# Altium footprint library WE-SHC.PcbLib: 139 footprints (part 2 of 10)
Each footprint in its own frame and in the unit in brackets; x right, y up, seen from the top. Pads: shape width x height; smd on the part's side, far side on the other; paste and mask are expansions set on the pad; w line width, h text height; cw(c..) or ccw(c..) is an arc to the next point about the centre after c.
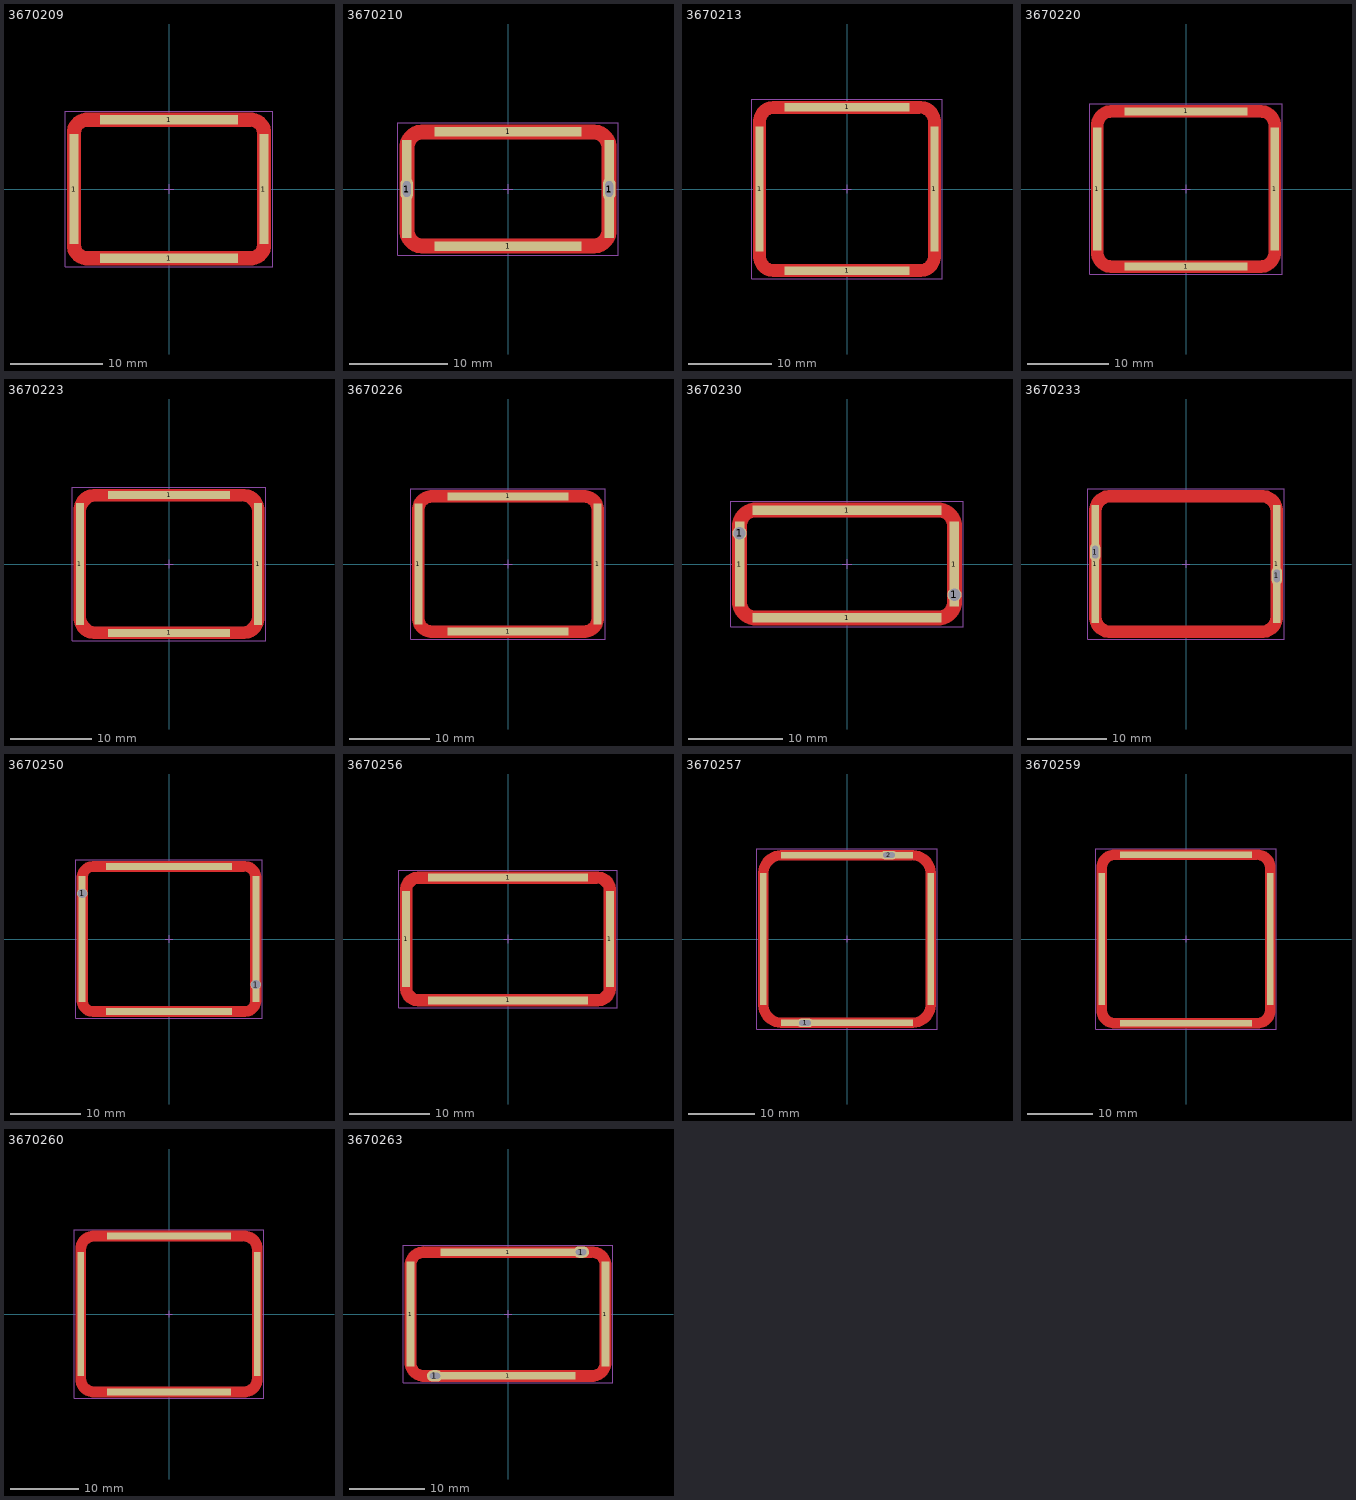
[diagram p1: the footprints below, top view; thin cyan lines are the x and y axes]

## 3670209 [mm] "Shielding Cabinet, SMT Frame Seamless, 20.9x15.3x1.7mm"
height 1.7
pads (4):
  rect 1x12 smd paste-2539.97 mask-2222: 1(-10.35,0) 1(10.35,0)
  rect 15x1 smd paste-2539.97 mask-2222: 1(0,-7.55) 1(0,7.55)
Top Layer:
  region: -11.1,-0.25 -11.1,-6.15 -11.1,-6.362 -11.017,-6.777 -10.855,-7.168 -10.62,-7.521 -10.321,-7.82 -9.968,-8.055 -9.577,-8.217 -9.162,-8.3 -8.95,-8.3 8.95,-8.3 9.162,-8.3 9.577,-8.217 9.968,-8.055 10.321,-7.82 10.62,-7.521 10.855,-7.168 11.017,-6.777 11.1,-6.362 11.1,-6.15 11.1,-0.25 9.6,-0.25 9.6,-6.15 9.588,-6.277 9.49,-6.511 9.311,-6.69 9.077,-6.788 8.95,-6.8 -8.95,-6.8 -9.077,-6.788 -9.311,-6.69 -9.49,-6.511 -9.588,-6.277 -9.6,-6.15 -9.6,-0.25
  region: -11.1,-1 -11.1,6.15 -11.1,6.362 -11.017,6.777 -10.855,7.168 -10.62,7.521 -10.321,7.82 -9.968,8.055 -9.577,8.217 -9.162,8.3 -8.95,8.3 8.95,8.3 9.162,8.3 9.577,8.217 9.968,8.055 10.321,7.82 10.62,7.521 10.855,7.168 11.017,6.777 11.1,6.362 11.1,6.15 11.1,-1 9.6,-1 9.6,6.15 9.588,6.277 9.49,6.511 9.311,6.69 9.077,6.788 8.95,6.8 -8.95,6.8 -9.077,6.788 -9.311,6.69 -9.49,6.511 -9.588,6.277 -9.6,6.15 -9.6,-1
Top Paste:
  region: -11.1,0.25 -11.1,6.15 -11.1,6.362 -11.017,6.777 -10.855,7.168 -10.62,7.521 -10.321,7.82 -9.968,8.055 -9.577,8.217 -9.162,8.3 -8.95,8.3 8.95,8.3 9.162,8.3 9.577,8.217 9.968,8.055 10.321,7.82 10.62,7.521 10.855,7.168 11.017,6.777 11.1,6.362 11.1,6.15 11.1,0.25 9.6,0.25 9.6,6.15 9.588,6.277 9.49,6.511 9.311,6.69 9.077,6.788 8.95,6.8 -8.95,6.8 -9.077,6.788 -9.311,6.69 -9.49,6.511 -9.588,6.277 -9.6,6.15 -9.6,0.25
  region: -11.1,-0.25 -11.1,-6.15 -11.1,-6.362 -11.017,-6.777 -10.855,-7.168 -10.62,-7.521 -10.321,-7.82 -9.968,-8.055 -9.577,-8.217 -9.162,-8.3 -8.95,-8.3 8.95,-8.3 9.162,-8.3 9.577,-8.217 9.968,-8.055 10.321,-7.82 10.62,-7.521 10.855,-7.168 11.017,-6.777 11.1,-6.362 11.1,-6.15 11.1,-0.25 9.6,-0.25 9.6,-6.15 9.588,-6.277 9.49,-6.511 9.311,-6.69 9.077,-6.788 8.95,-6.8 -8.95,-6.8 -9.077,-6.788 -9.311,-6.69 -9.49,-6.511 -9.588,-6.277 -9.6,-6.15 -9.6,-0.25
Notes:
  text "recommended tin paste thickness=0.5mm / customer to define the final stencil gap" at -5.6,-9.85 h0.4
Top Designator:
  text ".Designator" at -7.498,-0.5 h1.5
Top Component Outline:
  lines w0.1: -10.45,-6.15 ccw(c-8.95,-6.15) -8.95,-7.65 8.95,-7.65 ccw(c8.95,-6.15) 10.45,-6.15 10.45,6.15 ccw(c8.95,6.15) 8.95,7.65 -8.95,7.65 ccw(c-8.95,6.15) -10.45,6.15 -10.45,-6.15
Top 3D Body:
  lines w0.1: -10.45,-6.15 ccw(c-8.95,-6.15) -8.95,-7.65 8.95,-7.65 ccw(c8.95,-6.15) 10.45,-6.15 10.45,6.15 ccw(c8.95,6.15) 8.95,7.65 -8.95,7.65 ccw(c-8.95,6.15) -10.45,6.15 -10.45,-6.15
Top Courtyard:
  lines w0.05: -0.5,0 0.5,0 ; 0,-0.5 0,0.5 ; -11.3,-8.5 -11.3,8.5 11.3,8.5 11.3,-8.5 -11.3,-8.5
3D body "3670209.stp": height 1.7, standoff 0, extent -10.45,-7.65 10.45,7.65

## 3670210 [mm] "Shielding Cabinet, SMT Frame Seamless, 21x12x5mm"
height 5
pads (6):
  rect 1x10 smd paste-2539.97 mask-2222: 1(-10.35,0) 1(10.35,0)
  oval 1.3x2.4 hole 0.8 slot 1.6 at 90 deg: 1(-10.35,0) 1(10.35,0)
  rect 15x1 smd paste-2539.97 mask-2222: 1(0,-5.85) 1(0,5.85)
Top Layer:
  region: -11.1,-4.2 -11.1,4.2 -11.1,4.436 -11.008,4.9 -10.827,5.337 -10.564,5.73 -10.23,6.064 -9.837,6.327 -9.4,6.508 -8.936,6.6 -8.7,6.6 1,6.6 1,5.1 -8.7,5.1 -8.788,5.096 -8.961,5.061 -9.124,4.994 -9.271,4.896 -9.396,4.771 -9.494,4.624 -9.561,4.461 -9.596,4.288 -9.6,4.2 -9.6,-4.2 -9.596,-4.288 -9.561,-4.461 -9.494,-4.624 -9.396,-4.771 -9.271,-4.896 -9.124,-4.994 -8.961,-5.061 -8.788,-5.096 -8.7,-5.1 1,-5.1 1,-6.6 -8.7,-6.6 -8.936,-6.6 -9.4,-6.508 -9.837,-6.327 -10.23,-6.064 -10.564,-5.73 -10.827,-5.337 -11.008,-4.9 -11.1,-4.436
  region: 11.1,-4.2 11.1,4.2 11.1,4.436 11.008,4.9 10.827,5.337 10.564,5.73 10.23,6.064 9.837,6.327 9.4,6.508 8.936,6.6 8.7,6.6 0.25,6.6 0.25,5.1 8.7,5.1 8.788,5.096 8.961,5.061 9.124,4.994 9.271,4.896 9.396,4.771 9.494,4.624 9.561,4.461 9.596,4.288 9.6,4.2 9.6,-4.2 9.596,-4.288 9.561,-4.461 9.494,-4.624 9.396,-4.771 9.271,-4.896 9.124,-4.994 8.961,-5.061 8.788,-5.096 8.7,-5.1 0.25,-5.1 0.25,-6.6 8.7,-6.6 8.936,-6.6 9.4,-6.508 9.837,-6.327 10.23,-6.064 10.564,-5.73 10.827,-5.337 11.008,-4.9 11.1,-4.436
Top Paste:
  region: 11.1,-4.2 11.1,4.2 11.1,4.436 11.008,4.9 10.827,5.337 10.564,5.73 10.23,6.064 9.837,6.327 9.4,6.508 8.936,6.6 8.7,6.6 0.25,6.6 0.25,5.1 8.7,5.1 8.788,5.096 8.961,5.061 9.124,4.994 9.271,4.896 9.396,4.771 9.494,4.624 9.561,4.461 9.596,4.288 9.6,4.2 9.6,-4.2 9.596,-4.288 9.561,-4.461 9.494,-4.624 9.396,-4.771 9.271,-4.896 9.124,-4.994 8.961,-5.061 8.788,-5.096 8.7,-5.1 0.25,-5.1 0.25,-6.6 8.7,-6.6 8.936,-6.6 9.4,-6.508 9.837,-6.327 10.23,-6.064 10.564,-5.73 10.827,-5.337 11.008,-4.9 11.1,-4.436
  region: -11.1,-4.2 -11.1,4.2 -11.1,4.436 -11.008,4.9 -10.827,5.337 -10.564,5.73 -10.23,6.064 -9.837,6.327 -9.4,6.508 -8.936,6.6 -8.7,6.6 -0.25,6.6 -0.25,5.1 -8.7,5.1 -8.788,5.096 -8.961,5.061 -9.124,4.994 -9.271,4.896 -9.396,4.771 -9.494,4.624 -9.561,4.461 -9.596,4.288 -9.6,4.2 -9.6,-4.2 -9.596,-4.288 -9.561,-4.461 -9.494,-4.624 -9.396,-4.771 -9.271,-4.896 -9.124,-4.994 -8.961,-5.061 -8.788,-5.096 -8.7,-5.1 -0.25,-5.1 -0.25,-6.6 -8.7,-6.6 -8.936,-6.6 -9.4,-6.508 -9.837,-6.327 -10.23,-6.064 -10.564,-5.73 -10.827,-5.337 -11.008,-4.9 -11.1,-4.436
Notes:
  text "recommended tin paste thickness=0.5mm / customer to define the final stencil gap" at -5.6,-8.2 h0.4
Top Designator:
  text ".Designator" at -7.498,-0.5 h1.5
Top Component Outline:
  lines w0.1: -10.5,-4.25 ccw(c-8.75,-4.25) -8.75,-6 8.75,-6 ccw(c8.75,-4.25) 10.5,-4.25 10.5,4.25 ccw(c8.75,4.25) 8.75,6 -8.75,6 ccw(c-8.75,4.25) -10.5,4.25 -10.5,-4.25
Top 3D Body:
  lines w0.1: -10.5,-4.25 ccw(c-8.75,-4.25) -8.75,-6 8.75,-6 ccw(c8.75,-4.25) 10.5,-4.25 10.5,4.25 ccw(c8.75,4.25) 8.75,6 -8.75,6 ccw(c-8.75,4.25) -10.5,4.25 -10.5,-4.25
Top Courtyard:
  lines w0.05: -0.5,0 0.5,0 ; 0,-0.5 0,0.5 ; -11.3,-6.8 11.3,-6.8 11.3,6.8 -11.3,6.8 -11.3,-6.8
3D body "3670210.stp": height 5, standoff -1, extent -10.5,-6 10.5,6

## 3670213 [mm] "Shielding Cabinet, SMT Frame Seamless, 21.3x19.9x2.9mm"
height 2.9
pads (4):
  rect 1x15 smd paste-2539.97 mask-2222: 1(-10.5,0) 1(10.5,0)
  rect 15x1 smd paste-2539.97 mask-2222: 1(0,-9.8) 1(0,9.8)
Top Layer:
  region: -11.25,-1 -11.25,8.05 -11.25,8.296 -11.154,8.779 -10.965,9.234 -10.692,9.644 -10.344,9.992 -9.934,10.265 -9.479,10.454 -8.996,10.55 -8.75,10.55 8.75,10.55 8.996,10.55 9.479,10.454 9.934,10.265 10.344,9.992 10.692,9.644 10.965,9.234 11.154,8.779 11.25,8.296 11.25,8.05 11.25,-1 9.75,-1 9.75,8.05 9.745,8.148 9.707,8.34 9.632,8.521 9.523,8.684 9.384,8.823 9.221,8.932 9.04,9.007 8.848,9.045 8.75,9.05 -8.75,9.05 -8.848,9.045 -9.04,9.007 -9.221,8.932 -9.384,8.823 -9.523,8.684 -9.632,8.521 -9.707,8.34 -9.745,8.148 -9.75,8.05 -9.75,-1
  region: -11.25,-0.25 -11.25,-8.05 -11.25,-8.296 -11.154,-8.779 -10.965,-9.234 -10.692,-9.644 -10.344,-9.992 -9.934,-10.265 -9.479,-10.454 -8.996,-10.55 -8.75,-10.55 8.75,-10.55 8.996,-10.55 9.479,-10.454 9.934,-10.265 10.344,-9.992 10.692,-9.644 10.965,-9.234 11.154,-8.779 11.25,-8.296 11.25,-8.05 11.25,-0.25 9.75,-0.25 9.75,-8.05 9.745,-8.148 9.707,-8.34 9.632,-8.521 9.523,-8.684 9.384,-8.823 9.221,-8.932 9.04,-9.007 8.848,-9.045 8.75,-9.05 -8.75,-9.05 -8.848,-9.045 -9.04,-9.007 -9.221,-8.932 -9.384,-8.823 -9.523,-8.684 -9.632,-8.521 -9.707,-8.34 -9.745,-8.148 -9.75,-8.05 -9.75,-0.25
Top Paste:
  region: -11.25,-0.25 -11.25,-8.05 -11.25,-8.296 -11.154,-8.779 -10.965,-9.234 -10.692,-9.644 -10.344,-9.992 -9.934,-10.265 -9.479,-10.454 -8.996,-10.55 -8.75,-10.55 8.75,-10.55 8.996,-10.55 9.479,-10.454 9.934,-10.265 10.344,-9.992 10.692,-9.644 10.965,-9.234 11.154,-8.779 11.25,-8.296 11.25,-8.05 11.25,-0.25 9.75,-0.25 9.75,-8.05 9.745,-8.148 9.707,-8.34 9.632,-8.521 9.523,-8.684 9.384,-8.823 9.221,-8.932 9.04,-9.007 8.848,-9.045 8.75,-9.05 -8.75,-9.05 -8.848,-9.045 -9.04,-9.007 -9.221,-8.932 -9.384,-8.823 -9.523,-8.684 -9.632,-8.521 -9.707,-8.34 -9.745,-8.148 -9.75,-8.05 -9.75,-0.25
  region: -11.25,0.25 -11.25,8.05 -11.25,8.296 -11.154,8.779 -10.965,9.234 -10.692,9.644 -10.344,9.992 -9.934,10.265 -9.479,10.454 -8.996,10.55 -8.75,10.55 8.75,10.55 8.996,10.55 9.479,10.454 9.934,10.265 10.344,9.992 10.692,9.644 10.965,9.234 11.154,8.779 11.25,8.296 11.25,8.05 11.25,0.25 9.75,0.25 9.75,8.05 9.745,8.148 9.707,8.34 9.632,8.521 9.523,8.684 9.384,8.823 9.221,8.932 9.04,9.007 8.848,9.045 8.75,9.05 -8.75,9.05 -8.848,9.045 -9.04,9.007 -9.221,8.932 -9.384,8.823 -9.523,8.684 -9.632,8.521 -9.707,8.34 -9.745,8.148 -9.75,8.05 -9.75,0.25
Notes:
  text "recommended tin paste thickness=0.5mm / customer to define the final stencil gap" at -5.1,-12.2 h0.4
Top Designator:
  text ".Designator" at -7.498,-0.5 h1.5
Top Component Outline:
  lines w0.1: -10.65,-7.95 ccw(c-8.65,-7.95) -8.65,-9.95 8.65,-9.95 ccw(c8.65,-7.95) 10.65,-7.95 10.65,7.95 ccw(c8.65,7.95) 8.65,9.95 -8.65,9.95 ccw(c-8.65,7.95) -10.65,7.95 -10.65,-7.95
Top 3D Body:
  lines w0.1: -10.65,-7.95 ccw(c-8.65,-7.95) -8.65,-9.95 8.65,-9.95 ccw(c8.65,-7.95) 10.65,-7.95 10.65,7.95 ccw(c8.65,7.95) 8.65,9.95 -8.65,9.95 ccw(c-8.65,7.95) -10.65,7.95 -10.65,-7.95
Top Courtyard:
  lines w0.05: -0.5,0 0.5,0 ; 0,-0.5 0,0.5 ; -11.45,-10.75 11.45,-10.75 11.45,10.75 -11.45,10.75 -11.45,-10.75
3D body "3670213.stp": height 2.9, standoff 0, extent -10.65,-9.95 10.65,9.95

## 3670220 [mm] "Shielding Cabinet, SMT Frame Seamless, 22x19.3x3.3mm"
height 3.3
pads (4):
  rect 1x15 smd paste-2539.97 mask-2222: 1(-10.85,0) 1(10.85,0)
  rect 15x1 smd paste-2539.97 mask-2222: 1(0,-9.5) 1(0,9.5)
Top Layer:
  region: -11.6,-0.25 -11.6,-7.75 -11.6,-7.996 -11.504,-8.479 -11.315,-8.934 -11.042,-9.344 -10.694,-9.692 -10.284,-9.965 -9.829,-10.154 -9.346,-10.25 -9.1,-10.25 9.1,-10.25 9.346,-10.25 9.829,-10.154 10.284,-9.965 10.694,-9.692 11.042,-9.344 11.315,-8.934 11.504,-8.479 11.6,-7.996 11.6,-7.75 11.6,-0.25 10.1,-0.25 10.1,-7.75 10.095,-7.848 10.057,-8.04 9.982,-8.221 9.873,-8.384 9.734,-8.523 9.571,-8.632 9.39,-8.707 9.198,-8.745 9.1,-8.75 -9.1,-8.75 -9.198,-8.745 -9.39,-8.707 -9.571,-8.632 -9.734,-8.523 -9.873,-8.384 -9.982,-8.221 -10.057,-8.04 -10.095,-7.848 -10.1,-7.75 -10.1,-0.25
  region: -11.6,-1 -11.6,7.75 -11.6,7.996 -11.504,8.479 -11.315,8.934 -11.042,9.344 -10.694,9.692 -10.284,9.965 -9.829,10.154 -9.346,10.25 -9.1,10.25 9.1,10.25 9.346,10.25 9.829,10.154 10.284,9.965 10.694,9.692 11.042,9.344 11.315,8.934 11.504,8.479 11.6,7.996 11.6,7.75 11.6,-1 10.1,-1 10.1,7.75 10.095,7.848 10.057,8.04 9.982,8.221 9.873,8.384 9.734,8.523 9.571,8.632 9.39,8.707 9.198,8.745 9.1,8.75 -9.1,8.75 -9.198,8.745 -9.39,8.707 -9.571,8.632 -9.734,8.523 -9.873,8.384 -9.982,8.221 -10.057,8.04 -10.095,7.848 -10.1,7.75 -10.1,-1
Top Paste:
  region: -11.6,0.25 -11.6,7.75 -11.6,7.996 -11.504,8.479 -11.315,8.934 -11.042,9.344 -10.694,9.692 -10.284,9.965 -9.829,10.154 -9.346,10.25 -9.1,10.25 9.1,10.25 9.346,10.25 9.829,10.154 10.284,9.965 10.694,9.692 11.042,9.344 11.315,8.934 11.504,8.479 11.6,7.996 11.6,7.75 11.6,0.25 10.1,0.25 10.1,7.75 10.095,7.848 10.057,8.04 9.982,8.221 9.873,8.384 9.734,8.523 9.571,8.632 9.39,8.707 9.198,8.745 9.1,8.75 -9.1,8.75 -9.198,8.745 -9.39,8.707 -9.571,8.632 -9.734,8.523 -9.873,8.384 -9.982,8.221 -10.057,8.04 -10.095,7.848 -10.1,7.75 -10.1,0.25
  region: -11.6,-0.25 -11.6,-7.75 -11.6,-7.996 -11.504,-8.479 -11.315,-8.934 -11.042,-9.344 -10.694,-9.692 -10.284,-9.965 -9.829,-10.154 -9.346,-10.25 -9.1,-10.25 9.1,-10.25 9.346,-10.25 9.829,-10.154 10.284,-9.965 10.694,-9.692 11.042,-9.344 11.315,-8.934 11.504,-8.479 11.6,-7.996 11.6,-7.75 11.6,-0.25 10.1,-0.25 10.1,-7.75 10.095,-7.848 10.057,-8.04 9.982,-8.221 9.873,-8.384 9.734,-8.523 9.571,-8.632 9.39,-8.707 9.198,-8.745 9.1,-8.75 -9.1,-8.75 -9.198,-8.745 -9.39,-8.707 -9.571,-8.632 -9.734,-8.523 -9.873,-8.384 -9.982,-8.221 -10.057,-8.04 -10.095,-7.848 -10.1,-7.75 -10.1,-0.25
Notes:
  text "recommended tin paste thickness=0.5mm / customer to define the final stencil gap" at -6,-11.85 h0.4
Top Designator:
  text ".Designator" at -7.498,-0.5 h1.5
Top Component Outline:
  lines w0.1: -11,-7.65 ccw(c-9,-7.65) -9,-9.65 9,-9.65 ccw(c9,-7.65) 11,-7.65 11,7.65 ccw(c9,7.65) 9,9.65 -9,9.65 ccw(c-9,7.65) -11,7.65 -11,-7.65
Top 3D Body:
  lines w0.1: -11,-7.65 ccw(c-9,-7.65) -9,-9.65 9,-9.65 ccw(c9,-7.65) 11,-7.65 11,7.65 ccw(c9,7.65) 9,9.65 -9,9.65 ccw(c-9,7.65) -11,7.65 -11,-7.65
Top Courtyard:
  lines w0.05: -0.5,0 0.5,0 ; 0,-0.5 0,0.5 ; -11.8,-10.45 -11.8,10.45 11.8,10.45 11.8,-10.45 -11.8,-10.45
3D body "3670220.stp": height 3.3, standoff 0, extent -11,-9.65 11,9.65

## 3670223 [mm] "Shielding Cabinet, SMT Frame Seamless, 22.3x17.3x5mm"
height 5
pads (4):
  rect 1x15 smd paste-2539.97 mask-2222: 1(-11,0) 1(11,0)
  rect 15x1 smd paste-2539.97 mask-2222: 1(0,-8.5) 1(0,8.5)
Top Layer:
  region: -11.75,-1.3 -11.75,6.65 -11.75,6.906 -11.65,7.408 -11.454,7.882 -11.17,8.307 -10.807,8.67 -10.382,8.954 -9.908,9.15 -9.406,9.25 -9.15,9.25 9.15,9.25 9.406,9.25 9.908,9.15 10.382,8.954 10.807,8.67 11.17,8.307 11.454,7.882 11.65,7.408 11.75,6.906 11.75,6.65 11.75,-1.3 10.25,-1.3 10.25,6.45 10.244,6.577 10.194,6.827 10.096,7.063 9.955,7.275 9.775,7.455 9.563,7.596 9.327,7.694 9.077,7.744 8.95,7.75 -8.95,7.75 -9.077,7.744 -9.327,7.694 -9.563,7.596 -9.775,7.455 -9.955,7.275 -10.096,7.063 -10.194,6.827 -10.244,6.577 -10.25,6.45 -10.25,-1.3
  region: -11.75,-0.25 -11.75,-6.65 -11.75,-6.906 -11.65,-7.408 -11.454,-7.882 -11.17,-8.307 -10.807,-8.67 -10.382,-8.954 -9.908,-9.15 -9.406,-9.25 -9.15,-9.25 9.15,-9.25 9.406,-9.25 9.908,-9.15 10.382,-8.954 10.807,-8.67 11.17,-8.307 11.454,-7.882 11.65,-7.408 11.75,-6.906 11.75,-6.65 11.75,-0.25 10.25,-0.25 10.25,-6.45 10.244,-6.577 10.194,-6.827 10.096,-7.063 9.955,-7.275 9.775,-7.455 9.563,-7.596 9.327,-7.694 9.077,-7.744 8.95,-7.75 -8.95,-7.75 -9.077,-7.744 -9.327,-7.694 -9.563,-7.596 -9.775,-7.455 -9.955,-7.275 -10.096,-7.063 -10.194,-6.827 -10.244,-6.577 -10.25,-6.45 -10.25,-0.25
Top Paste:
  region: -11.75,-0.25 -11.75,-6.65 -11.75,-6.906 -11.65,-7.408 -11.454,-7.882 -11.17,-8.307 -10.807,-8.67 -10.382,-8.954 -9.908,-9.15 -9.406,-9.25 -9.15,-9.25 9.15,-9.25 9.406,-9.25 9.908,-9.15 10.382,-8.954 10.807,-8.67 11.17,-8.307 11.454,-7.882 11.65,-7.408 11.75,-6.906 11.75,-6.65 11.75,-0.25 10.25,-0.25 10.25,-6.45 10.244,-6.577 10.194,-6.827 10.096,-7.063 9.955,-7.275 9.775,-7.455 9.563,-7.596 9.327,-7.694 9.077,-7.744 8.95,-7.75 -8.95,-7.75 -9.077,-7.744 -9.327,-7.694 -9.563,-7.596 -9.775,-7.455 -9.955,-7.275 -10.096,-7.063 -10.194,-6.827 -10.244,-6.577 -10.25,-6.45 -10.25,-0.25
  region: -11.75,0.25 -11.75,6.65 -11.75,6.906 -11.65,7.408 -11.454,7.882 -11.17,8.307 -10.807,8.67 -10.382,8.954 -9.908,9.15 -9.406,9.25 -9.15,9.25 9.15,9.25 9.406,9.25 9.908,9.15 10.382,8.954 10.807,8.67 11.17,8.307 11.454,7.882 11.65,7.408 11.75,6.906 11.75,6.65 11.75,0.25 10.25,0.25 10.25,6.45 10.244,6.577 10.194,6.827 10.096,7.063 9.955,7.275 9.775,7.455 9.563,7.596 9.327,7.694 9.077,7.744 8.95,7.75 -8.95,7.75 -9.077,7.744 -9.327,7.694 -9.563,7.596 -9.775,7.455 -9.955,7.275 -10.096,7.063 -10.194,6.827 -10.244,6.577 -10.25,6.45 -10.25,0.25
Notes:
  text "recommended tin paste thickness=0.5mm / customer to define the final stencil gap" at -5.45,-10.8 h0.4
Top Designator:
  text ".Designator" at -7.498,-0.5 h1.5
Top Component Outline:
  lines w0.1: -11.15,-6.65 ccw(c-9.15,-6.65) -9.15,-8.65 9.15,-8.65 ccw(c9.15,-6.65) 11.15,-6.65 11.15,6.65 ccw(c9.15,6.65) 9.15,8.65 -9.15,8.65 ccw(c-9.15,6.65) -11.15,6.65 -11.15,-6.65
Top 3D Body:
  lines w0.1: -11.15,-6.65 ccw(c-9.15,-6.65) -9.15,-8.65 9.15,-8.65 ccw(c9.15,-6.65) 11.15,-6.65 11.15,6.65 ccw(c9.15,6.65) 9.15,8.65 -9.15,8.65 ccw(c-9.15,6.65) -11.15,6.65 -11.15,-6.65
Top Courtyard:
  lines w0.05: -0.5,0 0.5,0 ; 0,-0.5 0,0.5 ; -11.95,-9.45 11.95,-9.45 11.95,9.45 -11.95,9.45 -11.95,-9.45
3D body "3670223.stp": height 5, standoff 0, extent -11.15,-8.65 11.15,8.65

## 3670226 [mm] "Shielding Cabinet, SMT Frame Seamless, 22.6x17.1x2mm"
height 2
pads (4):
  rect 1x15 smd paste-2539.97 mask-2222: 1(-11.15,0) 1(11.15,0)
  rect 15x1 smd paste-2539.97 mask-2222: 1(0,-8.4) 1(0,8.4)
Top Layer:
  region: -11.9,-0.25 -11.9,-6.75 -11.9,-6.986 -11.808,-7.45 -11.627,-7.887 -11.364,-8.28 -11.03,-8.614 -10.637,-8.877 -10.2,-9.058 -9.736,-9.15 -9.5,-9.15 9.5,-9.15 9.736,-9.15 10.2,-9.058 10.637,-8.877 11.03,-8.614 11.364,-8.28 11.627,-7.887 11.808,-7.45 11.9,-6.986 11.9,-6.75 11.9,-0.25 10.4,-0.25 10.4,-6.75 10.396,-6.838 10.361,-7.011 10.294,-7.174 10.196,-7.321 10.071,-7.446 9.924,-7.544 9.761,-7.611 9.588,-7.646 9.5,-7.65 -9.5,-7.65 -9.588,-7.646 -9.761,-7.611 -9.924,-7.544 -10.071,-7.446 -10.196,-7.321 -10.294,-7.174 -10.361,-7.011 -10.396,-6.838 -10.4,-6.75 -10.4,-0.25
  region: -11.9,-1 -11.9,6.75 -11.9,6.986 -11.808,7.45 -11.627,7.887 -11.364,8.28 -11.03,8.614 -10.637,8.877 -10.2,9.058 -9.736,9.15 -9.5,9.15 9.5,9.15 9.736,9.15 10.2,9.058 10.637,8.877 11.03,8.614 11.364,8.28 11.627,7.887 11.808,7.45 11.9,6.986 11.9,6.75 11.9,-1 10.4,-1 10.4,6.75 10.396,6.838 10.361,7.011 10.294,7.174 10.196,7.321 10.071,7.446 9.924,7.544 9.761,7.611 9.588,7.646 9.5,7.65 -9.5,7.65 -9.588,7.646 -9.761,7.611 -9.924,7.544 -10.071,7.446 -10.196,7.321 -10.294,7.174 -10.361,7.011 -10.396,6.838 -10.4,6.75 -10.4,-1
Top Paste:
  region: -11.9,0.25 -11.9,6.75 -11.9,6.986 -11.808,7.45 -11.627,7.887 -11.364,8.28 -11.03,8.614 -10.637,8.877 -10.2,9.058 -9.736,9.15 -9.5,9.15 9.5,9.15 9.736,9.15 10.2,9.058 10.637,8.877 11.03,8.614 11.364,8.28 11.627,7.887 11.808,7.45 11.9,6.986 11.9,6.75 11.9,0.25 10.4,0.25 10.4,6.75 10.396,6.838 10.361,7.011 10.294,7.174 10.196,7.321 10.071,7.446 9.924,7.544 9.761,7.611 9.588,7.646 9.5,7.65 -9.5,7.65 -9.588,7.646 -9.761,7.611 -9.924,7.544 -10.071,7.446 -10.196,7.321 -10.294,7.174 -10.361,7.011 -10.396,6.838 -10.4,6.75 -10.4,0.25
  region: -11.9,-0.25 -11.9,-6.75 -11.9,-6.986 -11.808,-7.45 -11.627,-7.887 -11.364,-8.28 -11.03,-8.614 -10.637,-8.877 -10.2,-9.058 -9.736,-9.15 -9.5,-9.15 9.5,-9.15 9.736,-9.15 10.2,-9.058 10.637,-8.877 11.03,-8.614 11.364,-8.28 11.627,-7.887 11.808,-7.45 11.9,-6.986 11.9,-6.75 11.9,-0.25 10.4,-0.25 10.4,-6.75 10.396,-6.838 10.361,-7.011 10.294,-7.174 10.196,-7.321 10.071,-7.446 9.924,-7.544 9.761,-7.611 9.588,-7.646 9.5,-7.65 -9.5,-7.65 -9.588,-7.646 -9.761,-7.611 -9.924,-7.544 -10.071,-7.446 -10.196,-7.321 -10.294,-7.174 -10.361,-7.011 -10.396,-6.838 -10.4,-6.75 -10.4,-0.25
Notes:
  text "recommended tin paste thickness=0.5mm / customer to define the final stencil gap" at -5.45,-10.8 h0.4
Top Designator:
  text ".Designator" at -7.498,-0.5 h1.5
Top Component Outline:
  lines w0.1: -11.3,-6.8 ccw(c-9.55,-6.8) -9.55,-8.55 9.55,-8.55 ccw(c9.55,-6.8) 11.3,-6.8 11.3,6.8 ccw(c9.55,6.8) 9.55,8.55 -9.55,8.55 ccw(c-9.55,6.8) -11.3,6.8 -11.3,-6.8
Top 3D Body:
  lines w0.1: -11.3,-6.8 ccw(c-9.55,-6.8) -9.55,-8.55 9.55,-8.55 ccw(c9.55,-6.8) 11.3,-6.8 11.3,6.8 ccw(c9.55,6.8) 9.55,8.55 -9.55,8.55 ccw(c-9.55,6.8) -11.3,6.8 -11.3,-6.8
Top Courtyard:
  lines w0.05: -0.5,0 0.5,0 ; 0,-0.5 0,0.5 ; -12.1,-9.35 12.1,-9.35 12.1,9.35 -12.1,9.35 -12.1,-9.35
3D body "3670226.stp": height 2, standoff 0, extent -11.3,-8.55 11.3,8.55
